# Altium footprint library SparkFun-Connectors.PCBLIB: 409 footprints (part 20 of 26)
Each footprint in its own frame and in the unit in brackets; x right, y up, seen from the top. Pads: shape width x height; smd on the part's side, far side on the other; paste and mask are expansions set on the pad; w line width, h text height; cw(c..) or ccw(c..) is an arc to the next point about the centre after c.
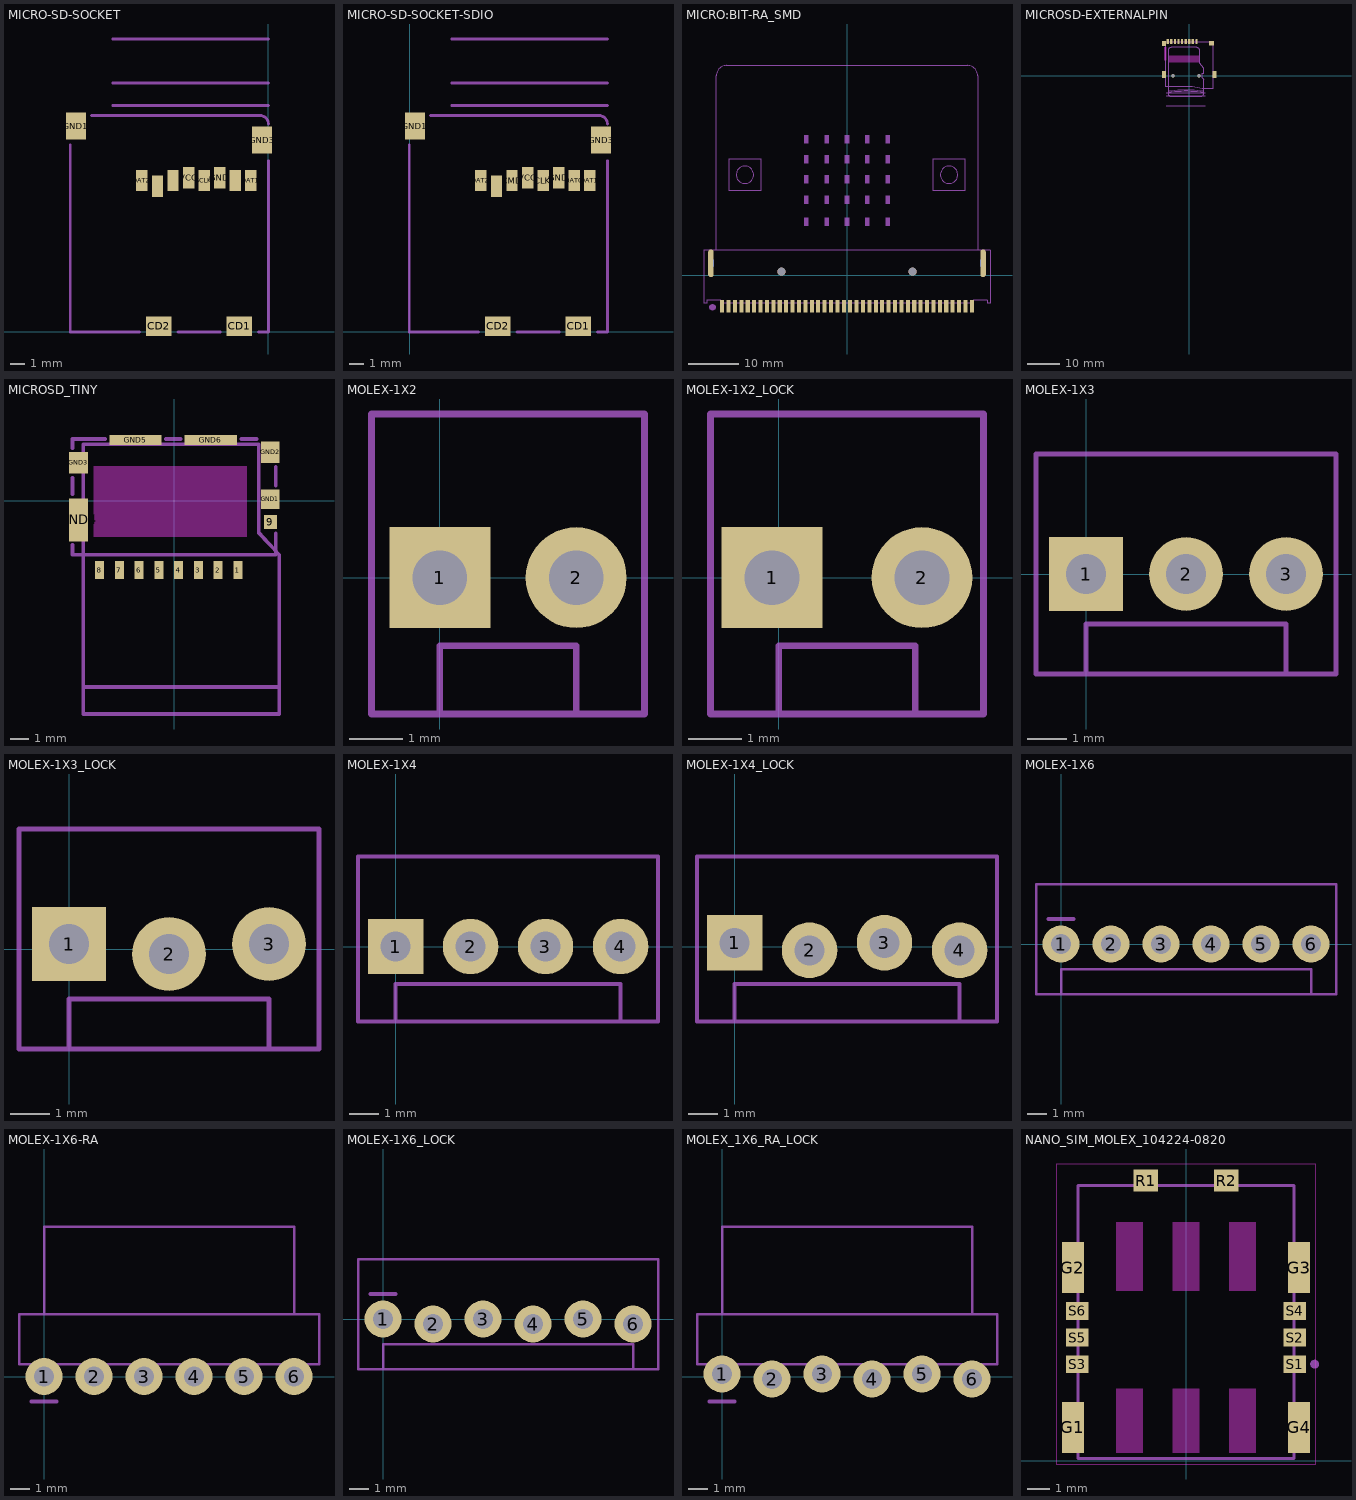
[diagram p19: the footprints below, top view; thin cyan lines are the x and y axes]

## MICRO-SD-SOCKET [mil]
pads (12):
  rect 70.87x55.12 smd: CD1(-80.71,15.75) CD2(-305.12,15.75)
  rect 31.5x59.06 smd: CS/DAT3(-308.66,405.51) DAT1(-48.82,421.26) DAT2(-351.97,421.26) DI/CMD(-265.35,421.26) DO/DAT0(-92.13,421.26) GND(-135.43,429.13) SCLK(-178.74,421.26) VCC(-222.05,429.13)
  rect 55.12x74.8 smd: GND1(-535.43,572.83) GND3(-17.72,533.46)
tDocu:
  lines w8: -433.07,629.92 0,629.92 ; -433.07,692.91 0,692.91 ; -433.07,814.96 0,814.96
  text "Pressed" at 25,625 h42.5
  text "Locked" at 25,700 h42.5
  text "Unlocked" at 25,825 h42.5
tPlace:
  lines w8: -551.18,519.68 -551.18,0 -358.27,0 ; -492.13,602.36 -23.62,602.36 cw(c-23.62,578.74) 0,578.74 ; -251.97,0 -133.86,0 ; -27.56,0 0,0 0,476.38

## MICRO-SD-SOCKET-SDIO [mil]
pads (12):
  rect 70.87x55.12 smd: CD1(469.29,15.75) CD2(244.88,15.75)
  rect 31.5x59.06 smd: CD/DAT3(241.34,405.51) CLK(371.26,421.26) CMD(284.65,421.26) DAT0(457.87,421.26) DAT1(501.18,421.26) DAT2(198.03,421.26) GND(414.57,429.13) VCC(327.95,429.13)
  rect 55.12x74.8 smd: GND1(14.57,572.83) GND3(532.28,533.46)
tDocu:
  lines w8: 116.93,629.92 550,629.92 ; 116.93,692.91 550,692.91 ; 116.93,814.96 550,814.96
  text "Pressed" at 575,625 h42.5
  text "Locked" at 575,700 h42.5
  text "Unlocked" at 575,825 h42.5
tPlace:
  lines w8: -1.18,519.68 -1.18,0 191.73,0 ; 57.87,602.36 526.38,602.36 cw(c526.38,578.74) 550,578.74 ; 298.03,0 416.14,0 ; 522.44,0 550,0 550,476.38

## MICRO:BIT-RA_SMD [mil]
pads (46):
  round 62.99 hole 62.99 unplated: MH1(511.81,27.56) MH2(-511.81,27.56)
  rect 31.5x98.43 smd: P$1(-975,-242.13) P$2(-925,-242.13) P$3(-875,-242.13) P$4(-825,-242.13) P$5(-775,-242.13) P$6(-725,-242.13) P$7(-675,-242.13) P$8(-625,-242.13) P$9(-575,-242.13) P$10(-525,-242.13) P$11(-475,-242.13) P$12(-425,-242.13) P$13(-375,-242.13) P$14(-325,-242.13) P$15(-275,-242.13) P$16(-225,-242.13) P$17(-175,-242.13) P$18(-125,-242.13) P$19(-75,-242.13) P$20(-25,-242.13) P$21(25,-242.13) P$22(75,-242.13) P$23(125,-242.13) P$24(175,-242.13) P$25(225,-242.13) P$26(275,-242.13) P$27(325,-242.13) P$28(375,-242.13) P$29(425,-242.13) P$30(475,-242.13) P$31(525,-242.13) P$32(575,-242.13) P$33(625,-242.13) P$34(675,-242.13) P$35(725,-242.13) P$36(775,-242.13) P$37(825,-242.13) P$38(875,-242.13) P$39(925,-242.13) P$40(975,-242.13)
  rrect100% 43.31x216.54 smd: P$42(-1062.99,92.91) P$43(1062.99,92.91)
  rrect100% 43.31x78.74 smd far side paste+0: P$44(-1062.99,92.91) P$45(1062.99,92.91)
Route2:
  region: -1084.65,137.91 -1041.34,137.91 -1041.34,49.57 -1084.65,49.57
  region: 1041.34,137.91 1084.65,137.91 1084.65,49.57 1041.34,49.57
Route15:
  region: -1084.65,137.91 -1041.34,137.91 -1041.34,49.57 -1084.65,49.57
  region: 1041.34,137.91 1084.65,137.91 1084.65,49.57 1041.34,49.57
Top Paste:
  region: -1062.99,-15.35 -1058.68,-15.35 -1050.73,-12.05 -1044.64,-5.96 -1041.34,1.99 -1041.34,6.3 -1041.34,179.53 -1041.34,183.84 -1044.64,191.79 -1050.73,197.88 -1058.68,201.18 -1062.99,201.18 -1067.3,201.18 -1075.26,197.89 -1081.35,191.8 -1084.65,183.84 -1084.65,179.53 -1084.65,6.3 -1084.65,1.99 -1081.35,-5.97 -1075.26,-12.06 -1067.3,-15.35 -1062.99,-15.35
  region: 1062.99,-15.35 1067.3,-15.35 1075.26,-12.06 1081.35,-5.97 1084.65,1.99 1084.65,6.3 1084.65,179.53 1084.65,183.84 1081.35,191.8 1075.26,197.89 1067.3,201.18 1062.99,201.18 1058.68,201.18 1050.73,197.88 1044.64,191.79 1041.34,183.84 1041.34,179.53 1041.34,6.3 1041.34,1.99 1044.64,-5.96 1050.73,-12.05 1058.68,-15.35 1062.99,-15.35
Top Solder:
  region: -1062.99,-15.35 -1067.3,-15.35 -1075.26,-12.06 -1081.35,-5.97 -1084.65,1.99 -1084.65,6.3 -1084.65,179.53 -1084.65,183.84 -1081.35,191.8 -1075.26,197.89 -1067.3,201.18 -1062.99,201.18 -1058.68,201.18 -1050.73,197.88 -1044.64,191.79 -1041.34,183.84 -1041.34,179.53 -1041.34,6.3 -1041.34,1.99 -1044.64,-5.96 -1050.73,-12.05 -1058.68,-15.35 -1062.99,-15.35
  region: 1062.99,-15.35 1058.68,-15.35 1050.73,-12.05 1044.64,-5.96 1041.34,1.99 1041.34,6.3 1041.34,179.53 1041.34,183.84 1044.64,191.79 1050.73,197.88 1058.68,201.18 1062.99,201.18 1067.3,201.18 1075.26,197.89 1081.35,191.8 1084.65,183.84 1084.65,179.53 1084.65,6.3 1084.65,1.99 1081.35,-5.97 1075.26,-12.06 1067.3,-15.35 1062.99,-15.35
Milling:
  lines w19.69: -1062.99,67.32 -1062.99,118.5 ; 1062.99,67.32 1062.99,118.5
tDocu:
  circle w5: c-797.05,784.45 r67.91
  circle w5: c797.05,784.45 r67.91
  region: -332.68,1031.5 -332.68,1094.49 -301.18,1094.49 -301.18,1031.5
  region: -15.75,1031.5 -15.75,1094.49 15.75,1094.49 15.75,1031.5
  region: 301.18,1031.5 301.18,1094.49 332.68,1094.49 332.68,1031.5
  region: -332.68,874.02 -332.68,937.01 -301.18,937.01 -301.18,874.02
  region: -15.75,874.02 -15.75,937.01 15.75,937.01 15.75,874.02
  region: 301.18,874.02 301.18,937.01 332.68,937.01 332.68,874.02
  region: -332.68,716.54 -332.68,779.53 -301.18,779.53 -301.18,716.54
  region: -15.75,716.54 -15.75,779.53 15.75,779.53 15.75,716.54
  region: 301.18,716.54 301.18,779.53 332.68,779.53 332.68,716.54
  region: -15.75,559.06 -15.75,622.05 15.75,622.05 15.75,559.06
  region: -15.75,385.83 -15.75,448.82 15.75,448.82 15.75,385.83
  region: -332.68,559.06 -332.68,622.05 -301.18,622.05 -301.18,559.06
  region: -332.68,385.83 -332.68,448.82 -301.18,448.82 -301.18,385.83
  region: 301.18,559.06 301.18,622.05 332.68,622.05 332.68,559.06
  region: 301.18,385.83 301.18,448.82 332.68,448.82 332.68,385.83
  region: -174.21,1031.5 -174.21,1094.49 -142.72,1094.49 -142.72,1031.5
  region: 142.72,1031.5 142.72,1094.49 174.21,1094.49 174.21,1031.5
  region: -174.21,874.02 -174.21,937.01 -142.72,937.01 -142.72,874.02
  region: 142.72,874.02 142.72,937.01 174.21,937.01 174.21,874.02
  region: 142.72,716.54 142.72,779.53 174.21,779.53 174.21,716.54
  region: -174.21,716.54 -174.21,779.53 -142.72,779.53 -142.72,716.54
  region: -174.21,559.06 -174.21,622.05 -142.72,622.05 -142.72,559.06
  region: 142.72,559.06 142.72,622.05 174.21,622.05 174.21,559.06
  region: -174.21,385.83 -174.21,448.82 -142.72,448.82 -142.72,385.83
  region: 142.72,385.83 142.72,448.82 174.21,448.82 174.21,385.83
  lines w5: -1020.08,196.85 1020.08,196.85 ; -1020.08,196.85 -1118.11,196.85 -1118.11,-220.47 -1093.7,-220.47 -1093.7,-196.85 -987.4,-196.85 -987.4,-220.47 987.4,-220.47 987.4,-196.85 1093.7,-196.85 1093.7,-220.47 1118.11,-220.47 1118.11,196.85 1020.08,196.85 ; -1020.08,196.85 -1020.08,1559.06 cw(c-941.34,1559.06) -941.34,1637.8 941.34,1637.8 cw(c941.34,1559.06) 1020.08,1559.06 1020.08,196.85 ; -920.08,661.42 -674.02,661.42 -674.02,907.48 -920.08,907.48 -920.08,661.42 ; 674.02,661.42 920.08,661.42 920.08,907.48 674.02,907.48 674.02,661.42
tPlace:
  region: -1075,-250 -1075,-254.97 -1071.19,-264.16 -1064.16,-271.19 -1054.97,-275 -1050,-275 -1045.03,-275 -1035.84,-271.19 -1028.81,-264.16 -1025,-254.97 -1025,-250 -1025,-245.03 -1028.81,-235.84 -1035.84,-228.81 -1045.03,-225 -1050,-225 -1054.97,-225 -1064.16,-228.81 -1071.19,-235.84 -1075,-245.03 -1075,-250

## MICROSD-EXTERNALPIN [mm]
pads (15):
  rect 0.7x1.6 smd: 1(2.25,10.5) 2(1.15,10.5) 3(0.05,10.5) 4(-1.05,10.5) 5(-2.15,10.5) 6(-3.25,10.5) 7(-4.35,10.5) 8(-5.45,10.5) 9(-6.55,10.5)
  rect 1.2x1.6 smd: 10(-7.75,9.9)
  rect 1.2x2.2 smd: 11(-7.75,0.4) 12(7.75,0.4)
  rect 1.6x1.4 smd: 13(6.85,10)
  round 1 hole 1 unplated: MH1(3.05,0) MH2(-4.95,0)
Top keep-out:
  region: -6.1,4.1 -6.1,6.1 2.9,6.1 2.9,4.1
  region: -7.7,4.7 -7.7,8.7 -7,8.7 -7,4.7
tDocu:
  region: -8.05,-0.2 -8.05,1 -7.2,1 -7.2,-0.2
  region: 8.05,1 8.05,-0.2 7.2,-0.2 7.2,1
  region: 6.35,9.5 6.35,10.5 7.2,10.5 7.2,9.5
  region: -8.05,9.5 -8.05,10.5 -7.2,10.5 -7.2,9.5
  region: -0.1,10.2 -0.1,11 0.2,11 0.2,10.2
  region: 1,10.2 1,11 1.3,11 1.3,10.2
  region: 2.1,10.2 2.1,11 2.4,11 2.4,10.2
  region: -1.2,10.2 -1.2,11 -0.9,11 -0.9,10.2
  region: -2.3,10.2 -2.3,11 -2,11 -2,10.2
  region: -3.4,10.2 -3.4,11 -3.1,11 -3.1,10.2
  region: -4.5,10.2 -4.5,11 -4.2,11 -4.2,10.2
  region: -5.6,10.2 -5.6,11 -5.3,11 -5.3,10.2
  region: -6.7,10.2 -6.7,11 -6.4,11 -6.4,10.2
  lines w0.05: -7,-9.3 5,-9.3 ; -7,-6.3 5,-6.3 ; -7,-5.3 5,-5.3 ; -6.45,-5.2 -6.45,-4.8 ; -6.45,-5.2 -6.45,-5.3 ccw(c-5.454,-5.305) -5.41,-6.3 3.55,-6.3 ccw(c3.555,-5.304) 4.55,-5.26 4.55,-5.2 ; -6.45,-5.2 cw(c-0.95,-42.799) 4.55,-5.2 ; -6.45,-4.8 -6.45,7.66 cw(c-5.455,7.704) -5.45,8.7 2.21,8.7 cw(c2.254,7.705) 3.25,7.7 3.25,3.8 4.55,2.3 4.55,0.7 3.95,0.7 3.95,-0.4 4.55,-1 4.55,-4.8 ; -6.45,-4.8 cw(c-0.95,-42.399) 4.55,-4.8 ; 4.55,-5.2 4.55,-4.8 ; -7.2,-3.3 1,-3.3 4,-4 7.2,-4 7.2,10.5 -7.2,10.5 -7.2,-3.3
tPlace:
  lines w0.203: -7.2,2 -7.2,8.5 ; 3.1,10.5 5.6,10.5 ; 7.2,2 7.2,8.9

## MICROSD_TINY [mm]
pads (15):
  rect 0.5x1 smd: 1(3.55,-3.85) 2(2.45,-3.85) 3(1.35,-3.85) 4(0.25,-3.85) 5(-0.85,-3.85) 6(-1.95,-3.85) 7(-3.05,-3.85) 8(-4.15,-3.85)
  rect 0.72x0.78 smd: 9(5.35,-1.17)
  rect 1.05x1.08 smd: GND1(5.35,0.1)
  rect 1.05x1.2 smd: GND2(5.35,2.71) GND3(-5.325,2.14)
  rect 1.05x2.39 smd: GND4(-5.325,-1.045)
  rect 2.91x0.55 smd: GND5(-2.145,3.385) GND6(2.045,3.385)
Top keep-out:
  region: -4.484,-1.984 -4.484,1.926 4.052,1.926 4.052,-1.984
tDocu:
  lines w0.203: -5.05,-10.35 -5.05,3.15 4.7,3.15 4.7,-1.75 5.85,-3 5.85,-10.35 ; -5.05,-10.35 -5.05,-11.85 5.85,-11.85 5.85,-10.35 ; -5.05,-10.35 5.85,-10.35
  text "uSD" at 0,-7 h1.55
tPlace:
  lines w0.203: -5.65,-2.45 -5.65,-3 5.65,-3 5.65,-1.8 ; -5.65,0.375 -5.65,1.3 ; -5.65,2.95 -5.65,3.45 -3.825,3.45 ; -0.45,3.45 0.375,3.45 ; 3.725,3.45 4.6,3.45 ; 5.65,0.85 5.65,1.9

## MOLEX-1X2 [mil]
pads (2):
  rect 74x74 / inner round 68.37 / far side rect 74x74 hole 40: 1(0,0)
  round 74 hole 40: 2(100,0)
tPlace:
  lines w5: 0,-100 100,-100 ; 0,-100 -50,-100 -50,120 150,120 150,-100 100,-100 ; 0,-100 0,-50 100,-50 100,-100

## MOLEX-1X2_LOCK [mil]
pads (2):
  rect 74x74 / inner round 68.37 / far side rect 74x74 hole 40: 1(-5,0)
  round 74 hole 40: 2(105,0)
tDocu:
  region: -11.5,-11.5 -11.5,11.5 11.5,11.5 11.5,-11.5
  region: 88.5,-11.5 88.5,11.5 111.5,11.5 111.5,-11.5
tPlace:
  lines w5: 0,-100 100,-100 ; 0,-100 -50,-100 -50,120 150,120 150,-100 100,-100 ; 0,-100 0,-50 100,-50 100,-100

## MOLEX-1X3 [mil]
pads (3):
  rect 74x74 / inner round 68.37 / far side rect 74x74 hole 40: 1(0,0)
  round 74 hole 40: 2(100,0) 3(200,0)
tPlace:
  lines w5: 0,-100 200,-100 ; 0,-100 -50,-100 -50,120 250,120 250,-100 200,-100 ; 0,-100 0,-50 200,-50 200,-100

## MOLEX-1X3_LOCK [mil]
pads (3):
  rect 74x74 / inner round 68.37 / far side rect 74x74 hole 40: 1(0,5)
  round 74 hole 40: 2(100,-5) 3(200,5)
tDocu:
  region: -11.5,-11.5 -11.5,11.5 11.5,11.5 11.5,-11.5
  region: 88.5,-11.5 88.5,11.5 111.5,11.5 111.5,-11.5
  region: 188.5,-11.5 188.5,11.5 211.5,11.5 211.5,-11.5
tPlace:
  lines w5: 0,-100 200,-100 ; 0,-100 -50,-100 -50,120 250,120 250,-100 200,-100 ; 0,-100 0,-50 200,-50 200,-100

## MOLEX-1X4 [mil]
pads (4):
  rect 74x74 / inner round 68.37 / far side rect 74x74 hole 40: 1(0,0)
  round 74 hole 40: 2(100,0) 3(200,0) 4(300,0)
tPlace:
  lines w5: 0,-100 300,-100 ; 0,-100 -50,-100 -50,120 350,120 350,-100 300,-100 ; 0,-100 0,-50 300,-50 300,-100

## MOLEX-1X4_LOCK [mil]
pads (4):
  rect 74x74 / inner round 68.37 / far side rect 74x74 hole 40: 1(0,5)
  round 74 hole 40: 2(100,-5) 3(200,5) 4(300,-5)
tPlace:
  lines w5: 0,-100 300,-100 ; 0,-100 -50,-100 -50,120 350,120 350,-100 300,-100 ; 0,-100 0,-50 300,-50 300,-100

## MOLEX-1X6 [mil]
pads (6):
  round 74 hole 40: 1(0,0) 2(100,0) 3(200,0) 4(300,0) 5(400,0) 6(500,0)
tPlace:
  lines w5: 0,-100 500,-100 ; 0,-100 -50,-100 -50,120 550,120 550,-100 500,-100 ; 0,-100 0,-50 500,-50 500,-100
  lines w8: -25,50 25,50
bPlace:
  lines w8: -25,50 25,50

## MOLEX-1X6-RA [mil]
pads (6):
  round 74 hole 40: 1(0,0) 2(100,0) 3(200,0) 4(300,0) 5(400,0) 6(500,0)
tPlace:
  lines w5: 0,125 500,125 ; 0,125 -50,125 -50,25 550,25 550,125 500,125 ; 0,125 0,300 500,300 500,125
  lines w8: -25,-50 25,-50
bPlace:
  lines w8: -25,-50 25,-50

## MOLEX-1X6_LOCK [mil]
pads (6):
  round 74 hole 40: 1(0,0) 2(100,-10) 3(200,0) 4(300,-10) 5(400,0) 6(500,-10)
tDocu:
  region: -11.5,-16.5 -11.5,6.5 11.5,6.5 11.5,-16.5
  region: 88.5,-16.5 88.5,6.5 111.5,6.5 111.5,-16.5
  region: 188.5,-16.5 188.5,6.5 211.5,6.5 211.5,-16.5
  region: 288.5,-16.5 288.5,6.5 311.5,6.5 311.5,-16.5
  region: 388.5,-16.5 388.5,6.5 411.5,6.5 411.5,-16.5
  region: 488.5,-16.5 488.5,6.5 511.5,6.5 511.5,-16.5
tPlace:
  lines w5: 0,-100 500,-100 ; 0,-100 -50,-100 -50,120 550,120 550,-100 500,-100 ; 0,-100 0,-50 500,-50 500,-100
  lines w8: -25,50 25,50
bPlace:
  lines w8: -25,50 25,50

## MOLEX_1X6_RA_LOCK [mil]
pads (6):
  round 74 hole 40: 1(0,5) 2(100,-5) 3(200,5) 4(300,-5) 5(400,5) 6(500,-5)
tPlace:
  lines w5: 0,125 500,125 ; 0,125 -50,125 -50,25 550,25 550,125 500,125 ; 0,125 0,300 500,300 500,125
  lines w8: -25,-50 25,-50
bPlace:
  lines w8: -25,-50 25,-50

## NANO_SIM_MOLEX_104224-0820 [mm]
pads (12):
  rect 1x2.3 smd: G1(-5.1,1.5) G2(-5.1,8.7) G3(5.1,8.7) G4(5.1,1.5)
  rect 1.1x1 smd: R1(-1.82,12.625) R2(1.82,12.625)
  rect 1x0.8 smd: S1(4.9,4.35) S2(4.9,5.55) S3(-4.9,4.35) S4(4.9,6.75) S5(-4.9,5.55) S6(-4.9,6.75)
Top keep-out:
  region: -0.601,0.351 -0.601,3.25 0.6,3.25 0.6,0.351
  region: -0.601,0.351 -0.601,3.25 0.6,3.25 0.6,0.351
  region: -3.146,0.351 -3.146,3.25 -1.94,3.25 -1.94,0.351
  region: -3.144,0.351 -3.144,3.25 -1.94,3.25 -1.94,0.351
  region: 1.943,0.351 1.943,3.25 3.14,3.25 3.14,0.351
  region: 1.941,0.35 1.941,3.25 3.14,3.25 3.14,0.35
  region: -0.601,7.663 -0.601,10.75 0.6,10.75 0.6,7.663
  region: -0.601,7.663 -0.601,10.75 0.6,10.75 0.6,7.663
  region: -3.142,7.656 -3.142,10.75 -1.94,10.75 -1.94,7.656
  region: -3.142,7.656 -3.142,10.75 -1.94,10.75 -1.94,7.656
  region: 1.941,7.652 1.941,10.75 3.14,10.75 3.14,7.652
  region: 1.94,7.65 1.94,10.75 3.14,10.75 3.14,7.65
  lines w0.05: -5.85,-0.15 5.85,-0.15 5.85,13.375 -5.85,13.375 -5.85,-0.15
tDocu:
  lines w0.127: -4.9,0.6 -5.275,0.6 -5.275,2.4 -4.9,2.4 ; -4.9,4.15 -5.1,4.15 -5.1,4.55 -4.9,4.55 ; -4.9,5.35 -5.1,5.35 -5.1,5.75 -4.9,5.75 ; -4.9,6.55 -5.1,6.55 -5.1,6.95 -4.9,6.95 ; -4.9,7.8 -5.275,7.8 -5.275,9.6 -4.9,9.6 ; 4.9,0.6 5.275,0.6 5.275,2.4 4.9,2.4 ; 4.9,4.15 5.1,4.15 5.1,4.55 4.9,4.55 ; 4.9,5.35 5.1,5.35 5.1,5.75 4.9,5.75 ; 4.9,6.55 5.1,6.55 5.1,6.95 4.9,6.95 ; 4.9,7.8 5.275,7.8 5.275,9.6 4.9,9.6 ; -2.12,12.4 -4.875,12.4 -4.875,0.1 4.875,0.1 4.875,12.4 2.12,12.4 ; -2.12,12.4 -1.52,12.4 ; -2.12,12.4 -2.12,12.8 -1.52,12.8 -1.52,12.4 ; -1.52,12.4 1.52,12.4 ; 1.52,12.4 2.12,12.4 ; 1.52,12.4 1.52,12.8 2.12,12.8 2.12,12.4
tPlace:
  circle w0.2: c5.8,4.35 r0.1
  lines w0.127: -4.875,0.1 4.875,0.1 ; -4.875,3 -4.875,3.6 ; -4.875,10.5 -4.875,12.4 -2.9,12.4 ; -0.4,12.4 0.5,12.4 ; 3.2,12.4 4.875,12.4 4.875,10.6 ; 4.875,3 4.875,3.6